# Altium footprint library Supernova Connectors.PcbLib: 303 footprints (part 14 of 19)
Each footprint in its own frame and in the unit in brackets; x right, y up, seen from the top. Pads: shape width x height; smd on the part's side, far side on the other; paste and mask are expansions set on the pad; w line width, h text height; cw(c..) or ccw(c..) is an arc to the next point about the centre after c.
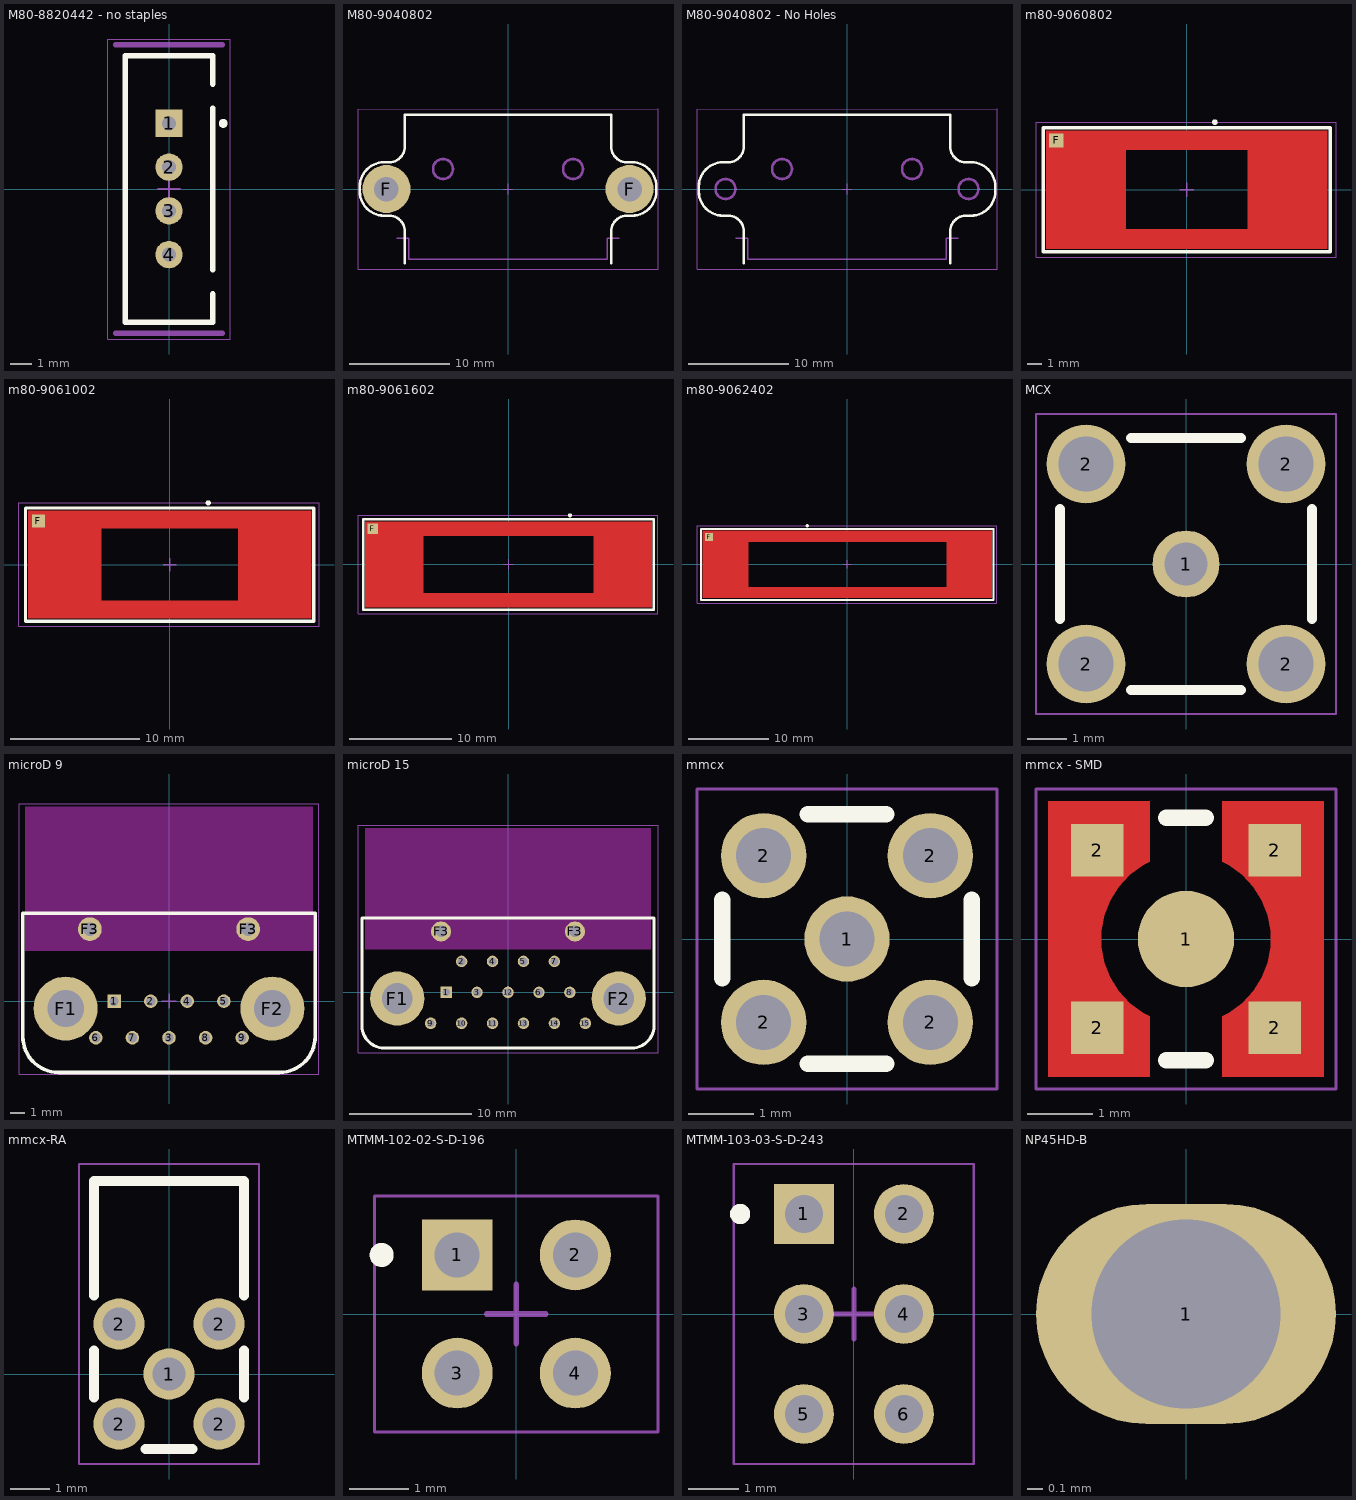
[diagram p13: the footprints below, top view; thin cyan lines are the x and y axes]

## M80-8820442 - no staples [mm]
pads (4):
  rect 1.25x1.25 hole 0.65 paste+0: 1(0,3)
  round 1.25 hole 0.65 paste+0: 2(0,1) 3(0,-1) 4(0,-3)
Top Overlay:
  circle w0.203: c2.478,3 r0.102
  lines w0.254: 2,4.8 2,6.1 -2.001,6.1 -1.996,-6.1 2.005,-6.1 2.005,-4.8 ; 2.005,-3.683 2.005,3.683
Top 3D Body:
  lines w0.254: -2.425,-6.6 2.425,-6.6 ; -2.425,6.6 2.425,6.6
Top Courtyard:
  lines w0.05: -2.794,-6.858 -2.794,6.858 2.794,6.858 2.794,-6.858 -2.794,-6.858
  lines w0.1: -0.5,0 0.5,0 ; 0,-0.5 0,0.5
3D body "m80-8820442_asm.stp": height 8.05, standoff -3.65, extent -1.767,-5.95 2.083,5.95

## M80-9040802 [mm]
pads (2):
  round 4.8 hole 2.45: F(-12.15,0) F(12.15,0)
Top Overlay:
  lines w0.254: -10.315,-7.415 -10.315,-4.245 ccw(c-11.895,-4.245) -11.895,-2.665 -12.395,-2.665 cw(c-12.395,-0.245) -14.815,-0.245 -14.815,0.255 cw(c-12.395,0.255) -12.395,2.675 -11.895,2.675 ccw(c-11.895,4.255) -10.315,4.255 -10.315,7.425 10.325,7.425 10.325,4.255 ccw(c11.905,4.255) 11.905,2.675 12.405,2.675 cw(c12.405,0.255) 14.825,0.255 14.825,-0.245 cw(c12.405,-0.245) 12.405,-2.665 11.905,-2.665 ccw(c11.905,-4.245) 10.325,-4.245 10.325,-7.415
Top Solder:
  region: -12.395,-2.48 -11.895,-2.48 -11.721,-2.489 -11.378,-2.557 -11.056,-2.69 -10.766,-2.884 -10.519,-3.131 -10.325,-3.421 -10.192,-3.743 -10.124,-4.086 -10.115,-4.26 -10.115,-7.23 -9.025,-7.23 -9.025,0.27 -8.525,0.27 -8.525,5.77 8.535,5.77 8.535,0.27 9.035,0.27 9.035,-7.23 10.125,-7.23 10.125,-4.26 10.134,-4.086 10.202,-3.743 10.335,-3.421 10.529,-3.131 10.776,-2.884 11.066,-2.69 11.388,-2.557 11.731,-2.489 11.905,-2.48 12.405,-2.48 12.624,-2.48 13.053,-2.395 13.457,-2.227 13.82,-1.984 14.129,-1.675 14.372,-1.312 14.54,-0.908 14.625,-0.479 14.625,-0.26 14.625,0.24 14.625,0.459 14.54,0.888 14.372,1.292 14.129,1.655 13.82,1.964 13.457,2.207 13.053,2.375 12.624,2.46 12.405,2.46 11.905,2.46 11.731,2.469 11.388,2.537 11.066,2.67 10.776,2.864 10.529,3.111 10.335,3.401 10.202,3.723 10.134,4.066 10.125,4.24 10.125,7.21 -10.115,7.21 -10.115,4.24 -10.124,4.066 -10.192,3.723 -10.325,3.401 -10.519,3.111 -10.766,2.864 -11.056,2.67 -11.378,2.537 -11.721,2.469 -11.895,2.46 -12.395,2.46 -12.614,2.46 -13.043,2.375 -13.447,2.207 -13.81,1.964 -14.119,1.655 -14.362,1.292 -14.53,0.888 -14.615,0.459 -14.615,0.24 -14.615,-0.26 -14.615,-0.479 -14.53,-0.908 -14.362,-1.312 -14.119,-1.675 -13.81,-1.984 -13.447,-2.227 -13.043,-2.395 -12.614,-2.48
Mechanical 5:
  circle w0.254: c6.5,2 r1
  circle w0.254: c-6.5,2 r1
  lines w0.15: -11.1,-4.9 -9.92,-4.9 -9.92,-7 9.92,-7 9.92,-4.9 11.1,-4.9
Top Courtyard:
  lines w0.05: -15,-8 15,-8 15,8 -15,8 -15,-8
  lines w0.1: -0.5,0 0.5,0 ; 0,-0.5 0,0.5
3D body "m80-9040802.stp": height 7.42, standoff 0.03, extent -14.42,-7.02 14.42,7.02

## M80-9040802 - No Holes [mm]
Top Overlay:
  lines w0.254: -10.315,-7.415 -10.315,-4.245 ccw(c-11.895,-4.245) -11.895,-2.665 -12.395,-2.665 cw(c-12.395,-0.245) -14.815,-0.245 -14.815,0.255 cw(c-12.395,0.255) -12.395,2.675 -11.895,2.675 ccw(c-11.895,4.255) -10.315,4.255 -10.315,7.425 10.325,7.425 10.325,4.255 ccw(c11.905,4.255) 11.905,2.675 12.405,2.675 cw(c12.405,0.255) 14.825,0.255 14.825,-0.245 cw(c12.405,-0.245) 12.405,-2.665 11.905,-2.665 ccw(c11.905,-4.245) 10.325,-4.245 10.325,-7.415
Top Solder:
  region: -12.395,-2.48 -11.895,-2.48 -11.721,-2.489 -11.378,-2.557 -11.056,-2.69 -10.766,-2.884 -10.519,-3.131 -10.325,-3.421 -10.192,-3.743 -10.124,-4.086 -10.115,-4.26 -10.115,-7.23 -9.025,-7.23 -9.025,0.27 -8.525,0.27 -8.525,5.77 8.535,5.77 8.535,0.27 9.035,0.27 9.035,-7.23 10.125,-7.23 10.125,-4.26 10.134,-4.086 10.202,-3.743 10.335,-3.421 10.529,-3.131 10.776,-2.884 11.066,-2.69 11.388,-2.557 11.731,-2.489 11.905,-2.48 12.405,-2.48 12.624,-2.48 13.053,-2.395 13.457,-2.227 13.82,-1.984 14.129,-1.675 14.372,-1.312 14.54,-0.908 14.625,-0.479 14.625,-0.26 14.625,0.24 14.625,0.459 14.54,0.888 14.372,1.292 14.129,1.655 13.82,1.964 13.457,2.207 13.053,2.375 12.624,2.46 12.405,2.46 11.905,2.46 11.731,2.469 11.388,2.537 11.066,2.67 10.776,2.864 10.529,3.111 10.335,3.401 10.202,3.723 10.134,4.066 10.125,4.24 10.125,7.21 -10.115,7.21 -10.115,4.24 -10.124,4.066 -10.192,3.723 -10.325,3.401 -10.519,3.111 -10.766,2.864 -11.056,2.67 -11.378,2.537 -11.721,2.469 -11.895,2.46 -12.395,2.46 -12.614,2.46 -13.043,2.375 -13.447,2.207 -13.81,1.964 -14.119,1.655 -14.362,1.292 -14.53,0.888 -14.615,0.459 -14.615,0.24 -14.615,-0.26 -14.615,-0.479 -14.53,-0.908 -14.362,-1.312 -14.119,-1.675 -13.81,-1.984 -13.447,-2.227 -13.043,-2.395 -12.614,-2.48
Mechanical 5:
  circle w0.254: c12.15,0 r1
  circle w0.254: c-12.15,0 r1
  circle w0.254: c6.5,2 r1
  circle w0.254: c-6.5,2 r1
  lines w0.15: -11.1,-4.9 -9.92,-4.9 -9.92,-7 9.92,-7 9.92,-4.9 11.1,-4.9
Top Courtyard:
  lines w0.05: -15,-8 -15,8 15,8 15,-8 -15,-8
  lines w0.1: -0.5,0 0.5,0 ; 0,-0.5 0,0.5
3D body "m80-9040802.stp": height 7.42, standoff 0.03, extent -14.42,-7.02 14.42,7.02

## m80-9060802 [mm]
pads (1):
  rect 1x1 smd: F(-9.261,3.502)
Top Layer:
  rectangle: -10,-4.2 -4.3,4.2
  region: 8.3,-2.8 -8.3,-2.8 -8.3,-4.2 8.3,-4.2
  rectangle: -8.3,2.8 8.3,4.2
  region: 10,4.2 4.3,4.2 4.3,-4.2 10,-4.2
Top Overlay:
  circle w0.203: c2,4.795 r0.102
  lines w0.254: 10.183,4.394 10.183,-4.406 -10.2,-4.406 -10.2,4.4 10.183,4.4
Top Courtyard:
  lines w0.05: -10.7,-4.8 10.6,-4.8 10.6,4.8 -10.7,4.8 -10.7,-4.8
  lines w0.1: -0.5,0 0.5,0 ; 0,-0.5 0,0.5
3D body "m80-9060802.stp": height 7.72, standoff -0.02, extent -9.87,-4.02 9.87,4.02

## m80-9061002 [mm]
pads (1):
  rect 1x1 smd: F(-10.2,3.4)
Top Layer:
  rectangle: -11,-4.2 -5.3,4.2
  region: 8.3,-2.8 -8.3,-2.8 -8.3,-4.2 8.3,-4.2
  rectangle: -8.3,2.8 8.3,4.2
  region: 11,4.2 5.3,4.2 5.3,-4.2 11,-4.2
Top Overlay:
  circle w0.203: c3,4.795 r0.102
  lines w0.254: -11.2,-4.406 -11.2,4.4 11.183,4.394 11.183,-4.406 -11.2,-4.406
Top Courtyard:
  lines w0.05: -11.7,-4.8 11.6,-4.8 11.6,4.8 -11.7,4.8 -11.7,-4.8
  lines w0.1: -0.5,0 0.5,0 ; 0,-0.5 0,0.5
3D body "m80-9061002.stp": height 7.72, standoff -0.02, extent -10.87,-4.02 10.87,4.02

## m80-9061602 [mm]
pads (1):
  rect 1x1 smd: F(-13.261,3.502)
Top Layer:
  region: 14,4.2 8.3,4.2 8.3,-4.2 14,-4.2
  region: 8.8,-2.8 -8.6,-2.8 -8.6,-4.2 8.8,-4.2
  rectangle: -8.8,2.8 8.6,4.2
  rectangle: -14,-4.2 -8.3,4.2
Top Overlay:
  circle w0.203: c6,4.795 r0.102
  lines w0.254: -14.2,-4.406 14.183,-4.406 14.183,4.394 14.177,4.4 -14.2,4.4 -14.2,-4.406
Top Courtyard:
  lines w0.05: -14.7,-4.8 -14.7,4.8 14.6,4.8 14.6,-4.8 -14.7,-4.8
  lines w0.1: -0.5,0 0.5,0 ; 0,-0.5 0,0.5
3D body "m80-9061602.stp": height 7.72, standoff -0.02, extent -13.87,-4.02 13.87,4.02

## m80-9062402 [mm]
pads (1):
  rect 1x1 smd: F(-17.2,3.4)
Top Layer:
  region: 18,4.2 12.3,4.2 12.3,-4.2 18,-4.2
  rectangle: -12.7,2.8 12.6,4.2
  region: 12.7,-2.8 -12.6,-2.8 -12.6,-4.2 12.7,-4.2
  rectangle: -18,-4.2 -12.3,4.2
Top Overlay:
  circle w0.203: c-5,4.8 r0.102
  lines w0.254: -18.2,-4.406 18.183,-4.406 18.183,4.394 18.177,4.4 -18.2,4.4 -18.2,-4.406
Top Courtyard:
  lines w0.05: -18.7,-4.8 18.6,-4.8 18.6,4.8 -18.7,4.8 -18.7,-4.8
  lines w0.1: -0.5,0 0.5,0 ; 0,-0.5 0,0.5
3D body "m80-9062402.stp": height 7.72, standoff -0.02, extent -17.87,-4.02 17.87,4.02

## MCX [mm]
pads (5):
  round 1.7 hole 1.1: 1(0,0)
  round 2 hole 1.4: 2(-2.54,-2.54) 2(-2.54,2.54) 2(2.54,-2.54) 2(2.54,2.54)
Top Overlay:
  lines w0.254: -3.2,-1.4 -3.2,1.4 ; -1.4,-3.2 1.4,-3.2 ; -1.4,3.2 1.4,3.2 ; 3.2,-1.4 3.2,1.4
Top Courtyard:
  lines w0.05: -3.81,-3.81 3.81,-3.81 3.81,3.81 -3.81,3.81 -3.81,-3.81
  lines w0.1: -0.5,0 0.5,0 ; 0,-0.5 0,0.5
3D body "MCX-J-P-X-ST-TH1.step": height 5.81, standoff -2.7, extent -3,-3 3,3

## microD 9 [mil]
pads (13):
  rect 37x37 hole 25 mask+2: 1(-150,0)
  round 37 hole 25 mask+2: 2(-50,0) 3(0,-100) 4(50,0) 5(150,0) 6(-200,-100) 7(-100,-100) 8(100,-100) 9(200,-100)
  round 175 hole 100 paste+0 mask+0: F1(-282.5,-20) F2(282.5,-20)
  round 65 hole 37 unplated paste+0 mask+0: F3(-216.54,196.85) F3(216.54,196.85)
Top Layer keep-out:
  rectangle: -393.7,137.8 393.7,531.5
Top Overlay:
  lines w10: -400,-96.06 -400,240 400,240 400,-96.06 ; -399.61,-96.46 ccw(c-301.18,-96.46) -301.18,-194.88 301.18,-194.88 ccw(c301.18,-96.46) 399.61,-96.46
Top Courtyard:
  lines w1.97: -410,-200 -410,540 410,540 410,-200 -410,-200
  lines w3.94: -19.68,0 19.68,0 ; 0,-19.68 0,19.69
3D body "MDA209SCBRPG1.STEP": height 301.57, standoff -108.66, extent -389.96,-185.04 389.96,425.98

## microD 15 [mil]
pads (19):
  rect 37x37 hole 25 mask+2: 1(-200,0)
  round 37 hole 25 mask+2: 2(-150,100) 3(-100,0) 4(-50,100) 5(50,100) 6(100,0) 7(150,100) 8(200,0) 9(-250,-100) 10(-150,-100) 11(-50,-100) 12(0,0) 13(50,-100) 14(150,-100) 15(250,-100)
  round 175 hole 100 paste+0 mask+0: F1(-358,-20) F2(358,-20)
  round 65 hole 37 unplated paste+0 mask+0: F3(-216.54,196.85) F3(216.54,196.85)
Top Layer keep-out:
  rectangle: -462.33,137.8 462.67,531.5
Top Overlay:
  lines w10: -472,-108 ccw(c-400,-108) -400,-180 400,-180 ccw(c400,-108) 472,-108 472,240 -472,240 -472,-108
Top Courtyard:
  lines w1.97: -485,-195 -485,540 485,540 485,-195 -485,-195
  lines w3.94: -19.68,0 19.68,0 ; 0,-19.68 0,19.69
3D body "MDM15SCBRP.stp": height 298.61, standoff -107.89, extent -462.33,-169.94 462.67,423.06

## mmcx [mm]
pads (5):
  round 1.3 hole 0.84: 1(0,0) 2(-1.27,-1.27) 2(-1.27,1.27) 2(1.27,-1.27) 2(1.27,1.27)
Top Overlay:
  lines w0.254: -1.9,-0.6 -1.9,0.6 ; -0.6,-1.9 0.6,-1.9 ; -0.6,1.9 0.6,1.9 ; 1.9,-0.6 1.9,0.6
Top Courtyard:
  lines w0.05: -2.286,-2.286 -2.286,2.286 2.286,2.286 2.286,-2.286 -2.286,-2.286
  lines w0.1: -0.5,0 0.5,0 ; 0,-0.5 0,0.5
3D body "MMCX-R-PC(40).STEP": height 4.49, standoff -2.88, extent -1.75,-1.75 1.75,1.75

## mmcx - SMD [mm]
pads (5):
  round 1.47 smd: 1(0,0)
  rect 0.8x0.8 smd mask+0.102: 2(-1.35,-1.35) 2(-1.35,1.35) 2(1.35,-1.35) 2(1.35,1.35)
Top Layer:
  region: -2.1,-2.1 -2.1,2.1 -0.55,2.1 -0.55,1.178 -0.659,1.121 -0.858,0.977 -1.026,0.799 -1.158,0.592 -1.248,0.364 -1.294,0.123 -1.294,-0.123 -1.248,-0.364 -1.158,-0.592 -1.026,-0.799 -0.858,-0.977 -0.659,-1.121 -0.55,-1.178 -0.55,-2.1
  region: 2.1,-2.1 2.1,2.1 0.55,2.1 0.55,1.178 0.659,1.121 0.858,0.977 1.026,0.799 1.158,0.592 1.248,0.364 1.294,0.123 1.294,-0.123 1.248,-0.364 1.158,-0.592 1.026,-0.799 0.858,-0.977 0.659,-1.121 0.55,-1.178 0.55,-2.1
Top Overlay:
  lines w0.254: -0.3,-1.85 0.3,-1.85 ; -0.3,1.85 0.3,1.85
Top Courtyard:
  lines w0.05: -2.286,-2.286 -2.286,2.286 2.286,2.286 2.286,-2.286 -2.286,-2.286
  lines w0.1: -0.5,0 0.5,0 ; 0,-0.5 0,0.5
3D body "734152064.stp": height 5, standoff -0.01, extent -1.725,-1.725 1.725,1.725

## mmcx-RA [mm]
pads (5):
  round 1.3 hole 0.84: 1(0,0) 2(-1.27,-1.27) 2(-1.27,1.27) 2(1.27,-1.27) 2(1.27,1.27)
Top Overlay:
  lines w0.254: -1.9,-0.6 -1.9,0.6 ; -1.9,2 -1.9,4.9 -0.6,4.9 0.6,4.9 1.9,4.9 1.9,2 ; -0.6,-1.9 0.6,-1.9 ; 1.9,-0.6 1.9,0.6
Top Courtyard:
  lines w0.05: -2.286,-2.286 -2.286,5.334 2.286,5.334 2.286,-2.286 -2.286,-2.286
  lines w0.1: -0.5,0 0.5,0 ; 0,-0.5 0,0.5
3D body "MMCX-J-P-H-RA-TH1.stp": height 3.8, standoff -3, extent -1.75,-1.75 1.75,4.75

## MTMM-102-02-S-D-196 [mm]
pads (4):
  rect 1.2x1.2 hole 0.762: 1(-1,1)
  round 1.2 hole 0.762: 2(1,1) 3(-1,-1) 4(1,-1)
Top Overlay:
  circle w0.203: c-2.278,1 r0.102
Bottom Overlay:
  circle w0.203: c-2.578,1 r0.102
  lines w0.254: -2.2,-2 2.2,-2 2.2,2 -2.2,2 -2.2,-2
Top Courtyard:
  lines w0.05: -2.4,-2 -2.4,2 2.4,2 2.4,-2 -2.4,-2
  lines w0.1: -0.5,0 0.5,0 ; 0,-0.5 0,0.5
Bottom Courtyard:
  lines w0.05: -2.4,-2 -2.4,2 2.4,2 2.4,-2 -2.4,-2
  lines w0.1: -0.5,0 0.5,0 ; 0,-0.5 0,0.5
3D body "MTMM-102-02-S-D-196.stp": height 1.55, standoff -4.93, extent -1.968,-2 1.969,2

## MTMM-103-03-S-D-243 [mm]
pads (6):
  rect 1.2x1.2 hole 0.762: 1(-1,2)
  round 1.2 hole 0.762: 2(1,2) 3(-1,0) 4(1,0) 5(-1,-2) 6(1,-2)
Top Overlay:
  circle w0.203: c-2.278,2 r0.102
Bottom Overlay:
  circle w0.203: c-2.578,2 r0.102
  lines w0.254: -2.2,-3 -2.2,3 2.2,3 2.2,-3 -2.2,-3
Top Courtyard:
  lines w0.05: -2.4,-3 -2.4,3 2.4,3 2.4,-3 -2.4,-3
  lines w0.1: -0.5,0 0.5,0 ; 0,-0.5 0,0.5
Bottom Courtyard:
  lines w0.05: -2.4,-3 -2.4,3 2.4,3 2.4,-3 -2.4,-3
  lines w0.1: -0.5,0 0.5,0 ; 0,-0.5 0,0.5
3D body "MTMM-103-03-S-D-243.stp": height 1.55, standoff -6.12, extent -1.968,-3 1.969,3

## NP45HD-B [mm]
pads (1):
  oval 1.905x1.397 hole 1.2: 1(0,0)